# Altium schematic symbol library Diode - Rectifier.SchLib: 777 symbols (part 4 of 4)
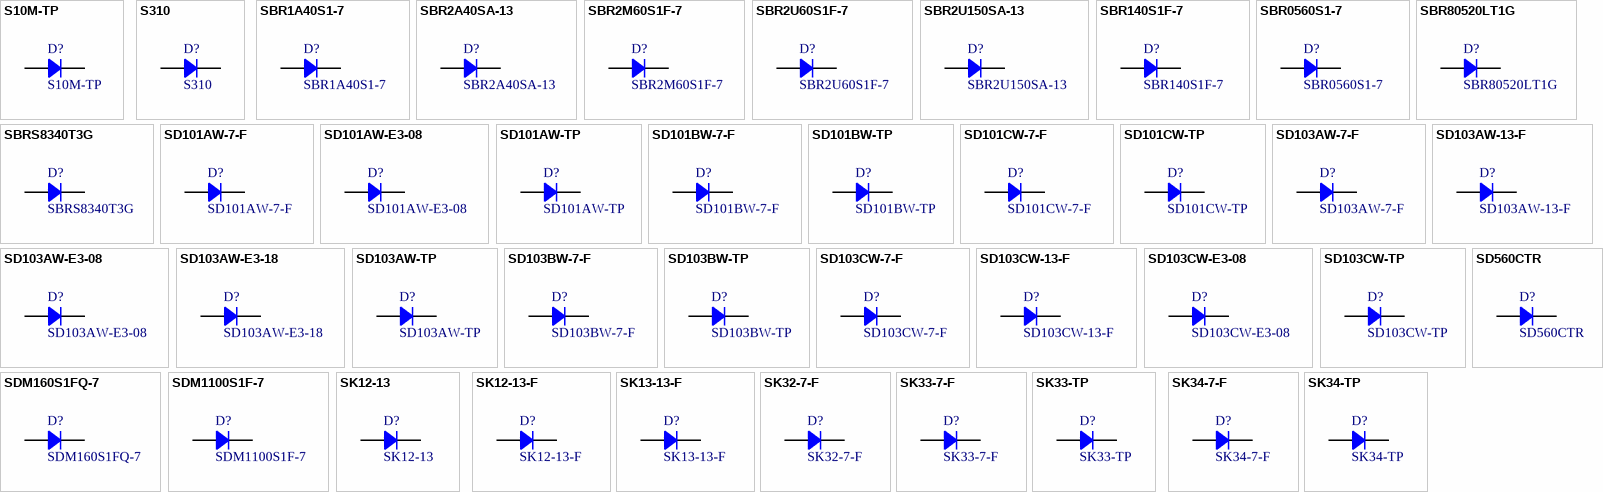
[diagram p22: symbols S10M-TP to SK34-TP]

## SDM1100S1F-7
designator D?
DIODE SCHOTTKY 100V 1A SOD123F; Manufacturer: Diodes Incorporated; Current Reverse Leakage @ Vr: 5uA @ 100V; Voltage Forward (Vf): 820mV @ 1A; Part Number: SDM1100S1F-7; PartId: 29289; Supplier 1: Digi-Key; Supplier Part Number 1: SDM1100S1F-7DICT-ND; ComponentLink1Description: Datasheet; ComponentLink1URL: http://www.diodes.com/_files/datasheets/SDM1100S1F.pdf; ComponentLink2Description: Digi-Key Listing; ComponentLink2URL: https://www.digikey.com/product-detail/en/diodes-incorporated/SDM1100S1F-7/SDM1100S1F-7DICT-ND/6010180; Junction Operating Temperature: -55C ~ 150C; Price: 0.47; Type: Schottky; Device Package: SOD-123F; Voltage DC Reverse (Vr): 100V; Current Rectified: 1A
footprint SOD123F
pins: 1, 2

## SK12-13
designator D?
DIODE SCHOTTKY 20V 1A SMB; Manufacturer: Diodes Incorporated; Current Reverse Leakage @ Vr: 500uA @ 20V; Voltage Forward (Vf): 550mV @ 1A; Part Number: SK12-13; PartId: 16314; Supplier 1: Digi-Key; Supplier Part Number 1: 981-SK12-13-CHP; ComponentLink1Description: Datasheet; ComponentLink1URL: //media.digikey.com/pdf/Data%20Sheets/Diodes%20PDFs/SK12-SK16.pdf; ComponentLink2Description: Digi-Key Listing; ComponentLink2URL: https://www.digikey.com/product-detail/en/diodes-incorporated/SK12-13/981-SK12-13-CHP/2344485; Junction Operating Temperature: -65C ~ 125C; Price: 0.1743; Type: Schottky; Device Package: DO-214AA, SMB; Voltage DC Reverse (Vr): 20V; Current Rectified: 1A
footprint DO214AA SMB
pins: 1, 2

## SK12-13-F
designator D?
DIODE SCHOTTKY 20V 1A SMB; Manufacturer: Diodes Incorporated; Current Reverse Leakage @ Vr: 500uA @ 20V; Voltage Forward (Vf): 550mV @ 1A; Part Number: SK12-13-F; PartId: 16263; Supplier 1: Digi-Key; Supplier Part Number 1: SK12-FDITR-ND; ComponentLink1Description: Datasheet; ComponentLink1URL: //media.digikey.com/pdf/Data%20Sheets/Diodes%20PDFs/SK12-SK16.pdf; ComponentLink2Description: Digi-Key Listing; ComponentLink2URL: https://www.digikey.com/product-detail/en/diodes-incorporated/SK12-13-F/SK12-FDITR-ND/814698; Junction Operating Temperature: -65C ~ 125C; Price: 0.2175; Type: Schottky; Device Package: DO-214AA, SMB; Voltage DC Reverse (Vr): 20V; Current Rectified: 1A
footprint DO214AA SMB
pins: 1, 2

## SK13-13-F
designator D?
DIODE SCHOTTKY 30V 1A SMB; Manufacturer: Diodes Incorporated; Current Reverse Leakage @ Vr: 500uA @ 30V; Voltage Forward (Vf): 550mV @ 1A; Part Number: SK13-13-F; PartId: 16264; Supplier 1: Digi-Key; Supplier Part Number 1: SK13-FDITR-ND; ComponentLink1Description: Datasheet; ComponentLink1URL: //media.digikey.com/pdf/Data%20Sheets/Diodes%20PDFs/SK12-SK16.pdf; ComponentLink2Description: Digi-Key Listing; ComponentLink2URL: https://www.digikey.com/product-detail/en/diodes-incorporated/SK13-13-F/SK13-FDITR-ND/725031; Junction Operating Temperature: -65C ~ 125C; Price: 0.2247; Type: Schottky; Device Package: DO-214AA, SMB; Voltage DC Reverse (Vr): 30V; Current Rectified: 1A
footprint DO214AA SMB
pins: 1, 2

## SK32-7-F
designator D?
DIODE SCHOTTKY 20V 3A SMC; Manufacturer: Diodes Incorporated; Current Reverse Leakage @ Vr: 500uA @ 20V; Voltage Forward (Vf): 500mV @ 3A; Part Number: SK32-7-F; PartId: 16230; Supplier 1: Digi-Key; Supplier Part Number 1: SK32-FDITR-ND; ComponentLink1Description: Datasheet; ComponentLink1URL: //media.digikey.com/pdf/Data%20Sheets/Diodes%20PDFs/SK32-SK36.pdf; ComponentLink2Description: Digi-Key Listing; ComponentLink2URL: https://www.digikey.com/product-detail/en/diodes-incorporated/SK32-7-F/SK32-FDITR-ND/814701; Junction Operating Temperature: -65C ~ 150C; Price: 0.684; Type: Schottky; Device Package: DO-214AB, SMC; Voltage DC Reverse (Vr): 20V; Current Rectified: 3A
footprint DO214AB SMC
pins: 1, 2

## SK33-7-F
designator D?
DIODE SCHOTTKY 30V 3A SMC; Manufacturer: Diodes Incorporated; Current Reverse Leakage @ Vr: 500uA @ 30V; Voltage Forward (Vf): 500mV @ 3A; Part Number: SK33-7-F; PartId: 27890; Supplier 1: Digi-Key; Supplier Part Number 1: SK33-FDICT-ND; ComponentLink1Description: Datasheet; ComponentLink1URL: //media.digikey.com/pdf/Data%20Sheets/Diodes%20PDFs/SK32-SK36.pdf; ComponentLink2Description: Digi-Key Listing; ComponentLink2URL: https://www.digikey.com/product-detail/en/diodes-incorporated/SK33-7-F/SK33-FDICT-ND/815991; Junction Operating Temperature: -65C ~ 150C; Price: 0.54; Type: Schottky; Device Package: DO-214AB, SMC; Voltage DC Reverse (Vr): 30V; Current Rectified: 3A
footprint ST DO214AB SMC
pins: 1, 2

## SK33-TP
designator D?
DIODE SCHOTTKY 30V 3A DO214AB; Manufacturer: Micro Commercial Co; Current Reverse Leakage @ Vr: 500uA @ 30V; Voltage Forward (Vf): 500mV @ 3A; Part Number: SK33-TP; PartId: 27768; Supplier 1: Digi-Key; Supplier Part Number 1: SK33-TPMSCT-ND; ComponentLink1Description: Datasheet; ComponentLink1URL: http://www.mccsemi.com/up_pdf/SK32-SK310(DO-214AB).PDF; ComponentLink2Description: Digi-Key Listing; ComponentLink2URL: https://www.digikey.com/product-detail/en/micro-commercial-co/SK33-TP/SK33-TPMSCT-ND/773726; Junction Operating Temperature: -55C ~ 150C; Price: 0.48; Type: Schottky; Device Package: DO-214AB, SMC; Voltage DC Reverse (Vr): 30V; Current Rectified: 3A
footprint ST DO214AB SMC
pins: 1, 2

## SK34-7-F
designator D?
DIODE SCHOTTKY 40V 3A SMC; Manufacturer: Diodes Incorporated; Current Reverse Leakage @ Vr: 500uA @ 40V; Voltage Forward (Vf): 500mV @ 3A; Part Number: SK34-7-F; PartId: 16231; Supplier 1: Digi-Key; Supplier Part Number 1: SK34-FDITR-ND; ComponentLink1Description: Datasheet; ComponentLink1URL: //media.digikey.com/pdf/Data%20Sheets/Diodes%20PDFs/SK32-SK36.pdf; ComponentLink2Description: Digi-Key Listing; ComponentLink2URL: https://www.digikey.com/product-detail/en/diodes-incorporated/SK34-7-F/SK34-FDITR-ND/806553; Junction Operating Temperature: -65C ~ 150C; Price: 0.722; Type: Schottky; Device Package: DO-214AB, SMC; Voltage DC Reverse (Vr): 40V; Current Rectified: 3A
footprint DO214AB SMC
pins: 1, 2

## SK34-TP
designator D?
DIODE SCHOTTKY 40V 3A DO214AB; Manufacturer: Micro Commercial Co; Current Reverse Leakage @ Vr: 500uA @ 40V; Voltage Forward (Vf): 500mV @ 3A; Part Number: SK34-TP; PartId: 27725; Supplier 1: Digi-Key; Supplier Part Number 1: SK34-TPMSCT-ND; ComponentLink1Description: Datasheet; ComponentLink1URL: http://www.mccsemi.com/up_pdf/SK32-SK310(DO-214AB).PDF; ComponentLink2Description: Digi-Key Listing; ComponentLink2URL: https://www.digikey.com/product-detail/en/micro-commercial-co/SK34-TP/SK34-TPMSCT-ND/773727; Junction Operating Temperature: -55C ~ 150C; Price: 0.48; Type: Schottky; Device Package: DO-214AB, SMC; Voltage DC Reverse (Vr): 40V; Current Rectified: 3A
footprint ST DO214AB SMC
pins: 1, 2

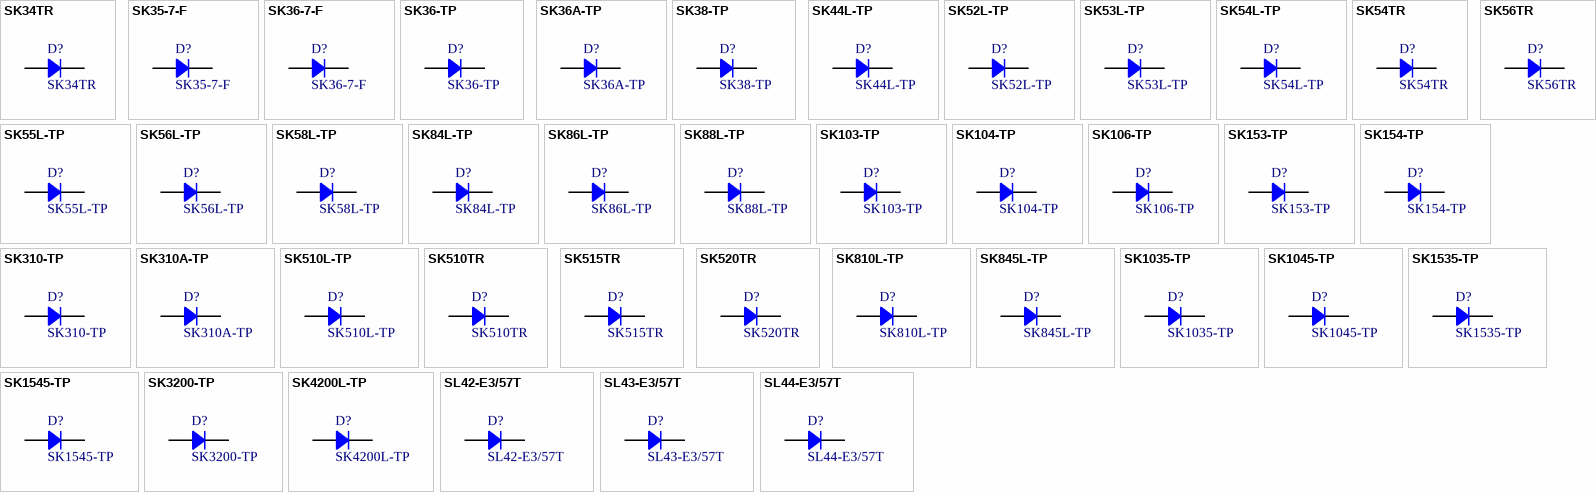
[diagram p16: symbols SK34TR to SL44-E3/57T]

## SK34TR
designator D?
DIODE SCHOTTKY 40V 3A SMB; Manufacturer: SMC Diode Solutions; Current Reverse Leakage @ Vr: 50uA @ 40V; Voltage Forward (Vf): 630mV @ 3A; Part Number: SK34TR; PartId: 27795; Supplier 1: Digi-Key; Supplier Part Number 1: 1655-1593-1-ND; ComponentLink1Description: Datasheet; ComponentLink1URL: http://www.smc-diodes.com/propdf/SK34%20N0102%20REV.-.pdf; ComponentLink2Description: Digi-Key Listing; ComponentLink2URL: https://www.digikey.com/product-detail/en/smc-diode-solutions/SK34TR/1655-1593-1-ND/6023038; Junction Operating Temperature: -55C ~ 150C; Price: 0.51; Type: Schottky; Device Package: DO-214AB, SMC; Voltage DC Reverse (Vr): 40V; Current Rectified: 3A
footprint ST DO214AB SMC
pins: 1, 2

## SK35-7-F
designator D?
DIODE SCHOTTKY 50V 3A SMC; Manufacturer: Diodes Incorporated; Current Reverse Leakage @ Vr: 500uA @ 50V; Voltage Forward (Vf): 750mV @ 3A; Part Number: SK35-7-F; PartId: 16233; Supplier 1: Digi-Key; Supplier Part Number 1: SK35-FDITR-ND; ComponentLink1Description: Datasheet; ComponentLink1URL: //media.digikey.com/pdf/Data%20Sheets/Diodes%20PDFs/SK32-SK36.pdf; ComponentLink2Description: Digi-Key Listing; ComponentLink2URL: https://www.digikey.com/product-detail/en/diodes-incorporated/SK35-7-F/SK35-FDITR-ND/814699; Junction Operating Temperature: -65C ~ 150C; Price: 0.264; Type: Schottky; Device Package: DO-214AB, SMC; Voltage DC Reverse (Vr): 50V; Current Rectified: 3A
footprint DO214AB SMC
pins: 1, 2

## SK36-7-F
designator D?
DIODE SCHOTTKY 60V 3A SMC; Manufacturer: Diodes Incorporated; Current Reverse Leakage @ Vr: 500uA @ 60V; Voltage Forward (Vf): 750mV @ 3A; Part Number: SK36-7-F; PartId: 16237; Supplier 1: Digi-Key; Supplier Part Number 1: SK36-FDITR-ND; ComponentLink1Description: Datasheet; ComponentLink1URL: //media.digikey.com/pdf/Data%20Sheets/Diodes%20PDFs/SK32-SK36.pdf; ComponentLink2Description: Digi-Key Listing; ComponentLink2URL: https://www.digikey.com/product-detail/en/diodes-incorporated/SK36-7-F/SK36-FDITR-ND/814709; Junction Operating Temperature: -65C ~ 150C; Price: 0.3; Type: Schottky; Device Package: DO-214AB, SMC; Voltage DC Reverse (Vr): 60V; Current Rectified: 3A
footprint DO214AB SMC
pins: 1, 2

## SK36-TP
designator D?
DIODE SCHOTTKY 60V 3A DO214AB; Manufacturer: Micro Commercial Co; Current Reverse Leakage @ Vr: 500uA @ 60V; Voltage Forward (Vf): 750mV @ 3A; Part Number: SK36-TP; PartId: 27724; Supplier 1: Digi-Key; Supplier Part Number 1: SK36-TPMSCT-ND; ComponentLink1Description: Datasheet; ComponentLink1URL: http://www.mccsemi.com/up_pdf/SK32-SK310(DO-214AB).PDF; ComponentLink2Description: Digi-Key Listing; ComponentLink2URL: https://www.digikey.com/product-detail/en/micro-commercial-co/SK36-TP/SK36-TPMSCT-ND/773729; Junction Operating Temperature: -55C ~ 150C; Price: 0.48; Type: Schottky; Device Package: DO-214AB, SMC; Voltage DC Reverse (Vr): 60V; Current Rectified: 3A
footprint ST DO214AB SMC
pins: 1, 2

## SK36A-TP
designator D?
DIODE SCHOTTKY 60V 3A DO214AC; Manufacturer: Micro Commercial Co; Current Reverse Leakage @ Vr: 500uA @ 60V; Voltage Forward (Vf): 750mV @ 3A; Part Number: SK36A-TP; PartId: 18055; Supplier 1: Digi-Key; Supplier Part Number 1: SK36A-TPTR-ND; ComponentLink1Description: Datasheet; ComponentLink1URL: http://www.mccsemi.com/up_pdf/SK32A-SK310A(HSMA).PDF; ComponentLink2Description: Digi-Key Listing; ComponentLink2URL: https://www.digikey.com/product-detail/en/micro-commercial-co/SK36A-TP/SK36A-TPTR-ND/950458; Junction Operating Temperature: -50C ~ 125C; Price: 0.157; Type: Schottky; Device Package: DO-214AC, SMA; Voltage DC Reverse (Vr): 60V; Current Rectified: 3A
footprint ST DO214AC SMA
pins: 1, 2

## SK38-TP
designator D?
DIODE SCHOTTKY 80V 3A DO214AB; Manufacturer: Micro Commercial Co; Current Reverse Leakage @ Vr: 500uA @ 80V; Voltage Forward (Vf): 850mV @ 3A; Part Number: SK38-TP; PartId: 27767; Supplier 1: Digi-Key; Supplier Part Number 1: SK38-TPMSCT-ND; ComponentLink1Description: Datasheet; ComponentLink1URL: http://www.mccsemi.com/up_pdf/SK32-SK310(DO-214AB).PDF; ComponentLink2Description: Digi-Key Listing; ComponentLink2URL: https://www.digikey.com/product-detail/en/micro-commercial-co/SK38-TP/SK38-TPMSCT-ND/773730; Junction Operating Temperature: -55C ~ 150C; Price: 0.48; Type: Schottky; Device Package: DO-214AB, SMC; Voltage DC Reverse (Vr): 80V; Current Rectified: 3A
footprint ST DO214AB SMC
pins: 1, 2

## SK44L-TP
designator D?
DIODE SCHOTTKY 4A 40V SMC; Manufacturer: Micro Commercial Co; Current Reverse Leakage @ Vr: 500uA @ 40V; Voltage Forward (Vf): 450mV @ 4A; Part Number: SK44L-TP; PartId: 27829; Supplier 1: Digi-Key; Supplier Part Number 1: SK44L-TPMSCT-ND; ComponentLink1Description: Datasheet; ComponentLink1URL: http://www.mccsemi.com/up_pdf/SK42L-SK44L(DO-214AB).pdf; ComponentLink2Description: Digi-Key Listing; ComponentLink2URL: https://www.digikey.com/product-detail/en/micro-commercial-co/SK44L-TP/SK44L-TPMSCT-ND/5418803; Junction Operating Temperature: -55C ~ 125C; Price: 0.49; Type: Schottky; Device Package: DO-214AB, SMC; Voltage DC Reverse (Vr): 40V; Current Rectified: 4A
footprint ST DO214AB SMC
pins: 1, 2

## SK52L-TP
designator D?
DIODE SCHOTTKY 20V 5A DO214AB; Manufacturer: Micro Commercial Co; Current Reverse Leakage @ Vr: 1mA @ 20V; Voltage Forward (Vf): 550mV @ 5A; Part Number: SK52L-TP; PartId: 27825; Supplier 1: Digi-Key; Supplier Part Number 1: SK52L-TPMSCT-ND; ComponentLink1Description: Datasheet; ComponentLink1URL: http://www.mccsemi.com/up_pdf/SK52L-SK510L(DO-214AB).PDF; ComponentLink2Description: Digi-Key Listing; ComponentLink2URL: https://www.digikey.com/product-detail/en/micro-commercial-co/SK52L-TP/SK52L-TPMSCT-ND/4966296; Junction Operating Temperature: -55C ~ 150C; Price: 0.49; Type: Schottky; Device Package: DO-214AB, SMC; Voltage DC Reverse (Vr): 20V; Current Rectified: 5A
footprint ST DO214AB SMC
pins: 1, 2

## SK53L-TP
designator D?
DIODE SCHOTTKY 30V 5A DO214AB; Manufacturer: Micro Commercial Co; Current Reverse Leakage @ Vr: 1mA @ 30V; Voltage Forward (Vf): 550mV @ 5A; Part Number: SK53L-TP; PartId: 27831; Supplier 1: Digi-Key; Supplier Part Number 1: SK53L-TPMSCT-ND; ComponentLink1Description: Datasheet; ComponentLink1URL: http://www.mccsemi.com/up_pdf/SK52L-SK510L(DO-214AB).PDF; ComponentLink2Description: Digi-Key Listing; ComponentLink2URL: https://www.digikey.com/product-detail/en/micro-commercial-co/SK53L-TP/SK53L-TPMSCT-ND/4966297; Junction Operating Temperature: -55C ~ 150C; Price: 0.49; Type: Schottky; Device Package: DO-214AB, SMC; Voltage DC Reverse (Vr): 30V; Current Rectified: 5A
footprint ST DO214AB SMC
pins: 1, 2

## SK54L-TP
designator D?
DIODE SCHOTTKY 40V 5A DO214AB; Manufacturer: Micro Commercial Co; Current Reverse Leakage @ Vr: 1mA @ 40V; Voltage Forward (Vf): 550mV @ 5A; Part Number: SK54L-TP; PartId: 27827; Supplier 1: Digi-Key; Supplier Part Number 1: SK54L-TPMSCT-ND; ComponentLink1Description: Datasheet; ComponentLink1URL: http://www.mccsemi.com/up_pdf/SK52L-SK510L(DO-214AB).PDF; ComponentLink2Description: Digi-Key Listing; ComponentLink2URL: https://www.digikey.com/product-detail/en/micro-commercial-co/SK54L-TP/SK54L-TPMSCT-ND/4071513; Junction Operating Temperature: -55C ~ 150C; Price: 0.49; Type: Schottky; Device Package: DO-214AB, SMC; Voltage DC Reverse (Vr): 40V; Current Rectified: 5A
footprint ST DO214AB SMC
pins: 1, 2

## SK54TR
designator D?
DIODE SCHOTTKY 40V SMC; Manufacturer: SMC Diode Solutions; Current Reverse Leakage @ Vr: 1mA @ 40V; Voltage Forward (Vf): 650mV @ 5A; Part Number: SK54TR; PartId: 27812; Supplier 1: Digi-Key; Supplier Part Number 1: 1655-1605-1-ND; ComponentLink1Description: Datasheet; ComponentLink1URL: http://www.smc-diodes.com/propdf/SK54%20N0939%20REV.-.pdf; ComponentLink2Description: Digi-Key Listing; ComponentLink2URL: https://www.digikey.com/product-detail/en/smc-diode-solutions/SK54TR/1655-1605-1-ND/6023050; Junction Operating Temperature: -55C ~ 150C; Price: 0.4; Type: Schottky; Device Package: DO-214AB, SMC; Voltage DC Reverse (Vr): 40V
footprint ST DO214AB SMC
pins: 1, 2

## SK55L-TP
designator D?
DIODE SCHOTTKY 50V 5A DO214AB; Manufacturer: Micro Commercial Co; Current Reverse Leakage @ Vr: 1mA @ 50V; Voltage Forward (Vf): 750mV @ 5A; Part Number: SK55L-TP; PartId: 27826; Supplier 1: Digi-Key; Supplier Part Number 1: SK55L-TPMSCT-ND; ComponentLink1Description: Datasheet; ComponentLink1URL: http://www.mccsemi.com/up_pdf/SK52L-SK510L(DO-214AB).PDF; ComponentLink2Description: Digi-Key Listing; ComponentLink2URL: https://www.digikey.com/product-detail/en/micro-commercial-co/SK55L-TP/SK55L-TPMSCT-ND/4071514; Junction Operating Temperature: -55C ~ 150C; Price: 0.49; Type: Schottky; Device Package: DO-214AB, SMC; Voltage DC Reverse (Vr): 50V; Current Rectified: 5A
footprint ST DO214AB SMC
pins: 1, 2

## SK56L-TP
designator D?
DIODE SCHOTTKY 60V 5A DO214AB; Manufacturer: Micro Commercial Co; Current Reverse Leakage @ Vr: 1mA @ 60V; Voltage Forward (Vf): 750mV @ 5A; Part Number: SK56L-TP; PartId: 27727; Supplier 1: Digi-Key; Supplier Part Number 1: SK56L-TPMSCT-ND; ComponentLink1Description: Datasheet; ComponentLink1URL: http://www.mccsemi.com/up_pdf/SK52L-SK510L(DO-214AB).PDF; ComponentLink2Description: Digi-Key Listing; ComponentLink2URL: https://www.digikey.com/product-detail/en/micro-commercial-co/SK56L-TP/SK56L-TPMSCT-ND/4071515; Junction Operating Temperature: -55C ~ 150C; Price: 0.49; Type: Schottky; Device Package: DO-214AB, SMC; Voltage DC Reverse (Vr): 60V; Current Rectified: 5A
footprint ST DO214AB SMC
pins: 1, 2

## SK56TR
designator D?
DIODE SCHOTTKY 60V SMB; Manufacturer: SMC Diode Solutions; Current Reverse Leakage @ Vr: 1mA @ 60V; Voltage Forward (Vf): 700mV @ 5A; Part Number: SK56TR; PartId: 27810; Supplier 1: Digi-Key; Supplier Part Number 1: 1655-1607-1-ND; ComponentLink1Description: Datasheet; ComponentLink1URL: http://www.smc-diodes.com/propdf/SK56%20N0940%20REV.-.pdf; ComponentLink2Description: Digi-Key Listing; ComponentLink2URL: https://www.digikey.com/product-detail/en/smc-diode-solutions/SK56TR/1655-1607-1-ND/6023052; Junction Operating Temperature: -55C ~ 150C; Price: 0.4; Type: Schottky; Device Package: DO-214AB, SMC; Voltage DC Reverse (Vr): 60V
footprint ST DO214AB SMC
pins: 1, 2

## SK58L-TP
designator D?
DIODE SCHOTTKY 80V 5A DO214AB; Manufacturer: Micro Commercial Co; Current Reverse Leakage @ Vr: 1mA @ 80V; Voltage Forward (Vf): 850mV @ 5A; Part Number: SK58L-TP; PartId: 27900; Supplier 1: Digi-Key; Supplier Part Number 1: SK58L-TPMSCT-ND; ComponentLink1Description: Datasheet; ComponentLink1URL: http://www.mccsemi.com/up_pdf/SK52L-SK510L(DO-214AB).PDF; ComponentLink2Description: Digi-Key Listing; ComponentLink2URL: https://www.digikey.com/product-detail/en/micro-commercial-co/SK58L-TP/SK58L-TPMSCT-ND/4966298; Junction Operating Temperature: -55C ~ 150C; Price: 0.49; Type: Schottky; Device Package: DO-214AB, SMC; Voltage DC Reverse (Vr): 80V; Current Rectified: 5A
footprint ST DO214AB SMC
pins: 1, 2

## SK84L-TP
designator D?
DIODE SCHOTTKY 40V 8A DO214AB; Manufacturer: Micro Commercial Co; Current Reverse Leakage @ Vr: 1mA @ 40V; Voltage Forward (Vf): 650mV @ 8A; Part Number: SK84L-TP; PartId: 27752; Supplier 1: Digi-Key; Supplier Part Number 1: SK84L-TPMSCT-ND; ComponentLink1Description: Datasheet; ComponentLink1URL: http://www.mccsemi.com/up_pdf/SK82L-SK810L(SMC).PDF; ComponentLink2Description: Digi-Key Listing; ComponentLink2URL: https://www.digikey.com/product-detail/en/micro-commercial-co/SK84L-TP/SK84L-TPMSCT-ND/3191624; Junction Operating Temperature: -55C ~ 150C; Price: 0.74; Type: Schottky; Device Package: DO-214AB, SMC; Voltage DC Reverse (Vr): 40V; Current Rectified: 8A
footprint ST DO214AB SMC
pins: 1, 2

## SK86L-TP
designator D?
DIODE SCHOTTKY 60V 8A DO214AB; Manufacturer: Micro Commercial Co; Current Reverse Leakage @ Vr: 1mA @ 60V; Voltage Forward (Vf): 650mV @ 8A; Part Number: SK86L-TP; PartId: 27701; Supplier 1: Digi-Key; Supplier Part Number 1: SK86L-TPMSCT-ND; ComponentLink1Description: Datasheet; ComponentLink1URL: http://www.mccsemi.com/up_pdf/SK82L-SK810L(SMC).PDF; ComponentLink2Description: Digi-Key Listing; ComponentLink2URL: https://www.digikey.com/product-detail/en/micro-commercial-co/SK86L-TP/SK86L-TPMSCT-ND/4966300; Junction Operating Temperature: -55C ~ 150C; Price: 0.74; Type: Schottky; Device Package: DO-214AB, SMC; Voltage DC Reverse (Vr): 60V; Current Rectified: 8A
footprint ST DO214AB SMC
pins: 1, 2

## SK88L-TP
designator D?
DIODE SCHOTTKY 80V 8A DO214AB; Manufacturer: Micro Commercial Co; Current Reverse Leakage @ Vr: 1mA @ 80V; Voltage Forward (Vf): 800mV @ 8A; Part Number: SK88L-TP; PartId: 27906; Supplier 1: Digi-Key; Supplier Part Number 1: SK88L-TPMSCT-ND; ComponentLink1Description: Datasheet; ComponentLink1URL: http://www.mccsemi.com/up_pdf/SK82L-SK810L(SMC).PDF; ComponentLink2Description: Digi-Key Listing; ComponentLink2URL: https://www.digikey.com/product-detail/en/micro-commercial-co/SK88L-TP/SK88L-TPMSCT-ND/4966301; Junction Operating Temperature: -55C ~ 150C; Price: 0.74; Type: Schottky; Device Package: DO-214AB, SMC; Voltage DC Reverse (Vr): 80V; Current Rectified: 8A
footprint ST DO214AB SMC
pins: 1, 2

## SK103-TP
designator D?
DIODE SCHOTTKY 30V 10A DO214AB; Manufacturer: Micro Commercial Co; Current Reverse Leakage @ Vr: 1mA @ 30V; Voltage Forward (Vf): 650mV @ 10A; Part Number: SK103-TP; PartId: 27757; Supplier 1: Digi-Key; Supplier Part Number 1: SK103-TPCT-ND; ComponentLink1Description: Datasheet; ComponentLink1URL: http://www.mccsemi.com/up_pdf/SK102-SK1010(HSMC).PDF; ComponentLink2Description: Digi-Key Listing; ComponentLink2URL: https://www.digikey.com/product-detail/en/micro-commercial-co/SK103-TP/SK103-TPCT-ND/1306211; Junction Operating Temperature: -55C ~ 125C; Price: 0.9; Type: Schottky; Device Package: DO-214AB, SMC; Voltage DC Reverse (Vr): 30V; Current Rectified: 10A
footprint ST DO214AB SMC
pins: 1, 2

## SK104-TP
designator D?
DIODE SCHOTTKY 40V 10A DO214AB; Manufacturer: Micro Commercial Co; Current Reverse Leakage @ Vr: 1mA @ 40V; Voltage Forward (Vf): 650mV @ 10A; Part Number: SK104-TP; PartId: 27706; Supplier 1: Digi-Key; Supplier Part Number 1: SK104-TPCT-ND; ComponentLink1Description: Datasheet; ComponentLink1URL: http://www.mccsemi.com/up_pdf/SK102-SK1010(HSMC).PDF; ComponentLink2Description: Digi-Key Listing; ComponentLink2URL: https://www.digikey.com/product-detail/en/micro-commercial-co/SK104-TP/SK104-TPCT-ND/1306212; Junction Operating Temperature: -55C ~ 125C; Price: 0.9; Type: Schottky; Device Package: DO-214AB, SMC; Voltage DC Reverse (Vr): 40V; Current Rectified: 10A
footprint ST DO214AB SMC
pins: 1, 2

## SK106-TP
designator D?
DIODE SCHOTTKY 60V 10A DO214AB; Manufacturer: Micro Commercial Co; Type: Surface Mount; Current Reverse Leakage @ Vr: 1mA @ 60V; Voltage Forward (Vf): 850mV @ 10A; Part Number: SK106-TP; PartId: 7135; Supplier 1: Digi-Key; Supplier Part Number 1: SK106-TPTR-ND; ComponentLink1Description: Datasheet; ComponentLink1URL: http://www.mccsemi.com/up_pdf/SK102-SK1010(HSMC).PDF; ComponentLink2Description: Digi-Key Listing; ComponentLink2URL: http://www.digikey.ca/product-detail/en/SK106-TP/SK106-TPTR-ND/1306162; Junction Operating Temperature: -55C ~ 125C; Price: 0.5378; Device Package: DO-214AB, SMC; Reverse Recovery Time (trr): -; Voltage DC Reverse (Vr): 60V; Current Rectified: 10A
footprint DO214AB SMC
pins: 1, 2

## SK153-TP
designator D?
DIODE SCHOTTKY 30V 15A DO214AB; Manufacturer: Micro Commercial Co; Type: Surface Mount; Current Reverse Leakage @ Vr: 1mA @ 30V; Voltage Forward (Vf): 550mV @ 15A; Part Number: SK153-TP; PartId: 7133; Supplier 1: Digi-Key; Supplier Part Number 1: SK153-TPTR-ND; ComponentLink1Description: Datasheet; ComponentLink1URL: http://www.mccsemi.com/up_pdf/SK152-SK1510(HSMC).PDF; ComponentLink2Description: Digi-Key Listing; ComponentLink2URL: http://www.digikey.ca/product-detail/en/SK153-TP/SK153-TPTR-ND/1306165; Junction Operating Temperature: -55C ~ 125C; Price: 0.753; Device Package: DO-214AB, SMC; Reverse Recovery Time (trr): -; Voltage DC Reverse (Vr): 30V; Current Rectified: 15A
footprint DO214AB SMC
pins: 1, 2

## SK154-TP
designator D?
DIODE SCHOTTKY 40V 15A DO214AB; Manufacturer: Micro Commercial Co; Type: Surface Mount; Current Reverse Leakage @ Vr: 1mA @ 40V; Voltage Forward (Vf): 550mV @ 15A; Part Number: SK154-TP; PartId: 7134; Supplier 1: Digi-Key; Supplier Part Number 1: SK154-TPTR-ND; ComponentLink1Description: Datasheet; ComponentLink1URL: http://www.mccsemi.com/up_pdf/SK152-SK1510(HSMC).PDF; ComponentLink2Description: Digi-Key Listing; ComponentLink2URL: http://www.digikey.ca/product-detail/en/SK154-TP/SK154-TPTR-ND/1306166; Junction Operating Temperature: -55C ~ 125C; Price: 0.753; Device Package: DO-214AB, SMC; Reverse Recovery Time (trr): -; Voltage DC Reverse (Vr): 40V; Current Rectified: 15A
footprint DO214AB SMC
pins: 1, 2

## SK310-TP
designator D?
DIODE SCHOTTKY 3A 100V SMC; Manufacturer: Micro Commercial Co; Current Reverse Leakage @ Vr: 500uA @ 100V; Voltage Forward (Vf): 850mV @ 3A; Part Number: SK310-TP; PartId: 27819; Supplier 1: Digi-Key; Supplier Part Number 1: SK310-TPMSCT-ND; ComponentLink1Description: Datasheet; ComponentLink1URL: http://www.mccsemi.com/up_pdf/SK32-SK310(DO-214AB).PDF; ComponentLink2Description: Digi-Key Listing; ComponentLink2URL: https://www.digikey.com/product-detail/en/micro-commercial-co/SK310-TP/SK310-TPMSCT-ND/5418802; Junction Operating Temperature: -55C ~ 150C; Price: 0.48; Type: Schottky; Device Package: DO-214AB, SMC; Voltage DC Reverse (Vr): 100V; Current Rectified: 3A
footprint ST DO214AB SMC
pins: 1, 2

## SK310A-TP
designator D?
DIODE SCHOTTKY 100V 3A DO214AC; Manufacturer: Micro Commercial Co; Current Reverse Leakage @ Vr: 500uA @ 100V; Voltage Forward (Vf): 850mV @ 3A; Part Number: SK310A-TP; PartId: 18051; Supplier 1: Digi-Key; Supplier Part Number 1: SK310A-TPTR-ND; ComponentLink1Description: Datasheet; ComponentLink1URL: http://www.mccsemi.com/up_pdf/SK32A-SK310A(HSMA).PDF; ComponentLink2Description: Digi-Key Listing; ComponentLink2URL: https://www.digikey.com/product-detail/en/micro-commercial-co/SK310A-TP/SK310A-TPTR-ND/950448; Junction Operating Temperature: -50C ~ 125C; Price: 0.157; Type: Schottky; Device Package: DO-214AC, SMA; Voltage DC Reverse (Vr): 100V; Current Rectified: 3A
footprint ST DO214AC SMA
pins: 1, 2

## SK510L-TP
designator D?
DIODE SCHOTTKY 100V 5A DO214AB; Manufacturer: Micro Commercial Co; Current Reverse Leakage @ Vr: 1mA @ 100V; Voltage Forward (Vf): 850mV @ 5A; Part Number: SK510L-TP; PartId: 27822; Supplier 1: Digi-Key; Supplier Part Number 1: SK510L-TPMSCT-ND; ComponentLink1Description: Datasheet; ComponentLink1URL: http://www.mccsemi.com/up_pdf/SK52L-SK510L(DO-214AB).PDF; ComponentLink2Description: Digi-Key Listing; ComponentLink2URL: https://www.digikey.com/product-detail/en/micro-commercial-co/SK510L-TP/SK510L-TPMSCT-ND/4071512; Junction Operating Temperature: -55C ~ 150C; Price: 0.49; Type: Schottky; Device Package: DO-214AB, SMC; Voltage DC Reverse (Vr): 100V; Current Rectified: 5A
footprint ST DO214AB SMC
pins: 1, 2

## SK510TR
designator D?
DIODE SCHOTTKY 100V SMB; Manufacturer: SMC Diode Solutions; Current Reverse Leakage @ Vr: 100uA @ 100V; Voltage Forward (Vf): 850mV @ 5A; Part Number: SK510TR; PartId: 27808; Supplier 1: Digi-Key; Supplier Part Number 1: 1655-1599-1-ND; ComponentLink1Description: Datasheet; ComponentLink1URL: http://www.smc-diodes.com/propdf/SK510%20N1113%20REV.-.pdf; ComponentLink2Description: Digi-Key Listing; ComponentLink2URL: https://www.digikey.com/product-detail/en/smc-diode-solutions/SK510TR/1655-1599-1-ND/6023044; Junction Operating Temperature: -55C ~ 150C; Price: 0.4; Type: Schottky; Device Package: DO-214AB, SMC; Voltage DC Reverse (Vr): 100V
footprint ST DO214AB SMC
pins: 1, 2

## SK515TR
designator D?
DIODE SCHOTTKY 150V SMB; Manufacturer: SMC Diode Solutions; Current Reverse Leakage @ Vr: 1mA @ 150V; Voltage Forward (Vf): 930mV @ 5A; Part Number: SK515TR; PartId: 27811; Supplier 1: Digi-Key; Supplier Part Number 1: 1655-1601-1-ND; ComponentLink1Description: Datasheet; ComponentLink1URL: http://www.smc-diodes.com/propdf/SK515%20N0636%20REV.-.pdf; ComponentLink2Description: Digi-Key Listing; ComponentLink2URL: https://www.digikey.com/product-detail/en/smc-diode-solutions/SK515TR/1655-1601-1-ND/6023046; Junction Operating Temperature: -55C ~ 150C; Price: 0.4; Type: Schottky; Device Package: DO-214AB, SMC; Voltage DC Reverse (Vr): 150V
footprint ST DO214AB SMC
pins: 1, 2

## SK520TR
designator D?
DIODE SCHOTTKY 200V 5A SMC; Manufacturer: SMC Diode Solutions; Current Reverse Leakage @ Vr: 1mA @ 200V; Voltage Forward (Vf): 1.1V @ 5A; Part Number: SK520TR; PartId: 27796; Supplier 1: Digi-Key; Supplier Part Number 1: 1655-1603-1-ND; ComponentLink1Description: Datasheet; ComponentLink1URL: http://www.smc-diodes.com/propdf/SK520%20N0107%20REV.-.pdf; ComponentLink2Description: Digi-Key Listing; ComponentLink2URL: https://www.digikey.com/product-detail/en/smc-diode-solutions/SK520TR/1655-1603-1-ND/6023048; Junction Operating Temperature: -55C ~ 150C; Price: 0.4; Type: Schottky; Device Package: DO-214AB, SMC; Voltage DC Reverse (Vr): 200V; Current Rectified: 5A
footprint ST DO214AB SMC
pins: 1, 2

## SK810L-TP
designator D?
DIODE SCHOTTKY 100V 8A DO214AB; Manufacturer: Micro Commercial Co; Current Reverse Leakage @ Vr: 1mA @ 100V; Voltage Forward (Vf): 800mV @ 8A; Part Number: SK810L-TP; PartId: 27700; Supplier 1: Digi-Key; Supplier Part Number 1: SK810L-TPMSCT-ND; ComponentLink1Description: Datasheet; ComponentLink1URL: http://www.mccsemi.com/up_pdf/SK82L-SK810L(SMC).PDF; ComponentLink2Description: Digi-Key Listing; ComponentLink2URL: https://www.digikey.com/product-detail/en/micro-commercial-co/SK810L-TP/SK810L-TPMSCT-ND/2650908; Junction Operating Temperature: -55C ~ 150C; Price: 0.74; Type: Schottky; Device Package: DO-214AB, SMC; Voltage DC Reverse (Vr): 100V; Current Rectified: 8A
footprint ST DO214AB SMC
pins: 1, 2

## SK845L-TP
designator D?
DIODE SCHOTTKY 45V 8A DO214AB; Manufacturer: Micro Commercial Co; Current Reverse Leakage @ Vr: 1mA @ 45V; Voltage Forward (Vf): 650mV @ 8A; Part Number: SK845L-TP; PartId: 27905; Supplier 1: Digi-Key; Supplier Part Number 1: SK845L-TPMSCT-ND; ComponentLink1Description: Datasheet; ComponentLink1URL: http://www.mccsemi.com/up_pdf/SK82L-SK810L(SMC).PDF; ComponentLink2Description: Digi-Key Listing; ComponentLink2URL: https://www.digikey.com/product-detail/en/micro-commercial-co/SK845L-TP/SK845L-TPMSCT-ND/4966299; Junction Operating Temperature: -55C ~ 150C; Price: 0.74; Type: Schottky; Device Package: DO-214AB, SMC; Voltage DC Reverse (Vr): 45V; Current Rectified: 8A
footprint ST DO214AB SMC
pins: 1, 2

## SK1035-TP
designator D?
DIODE SCHOTTKY 35V 10A DO214AB; Manufacturer: Micro Commercial Co; Current Reverse Leakage @ Vr: 1mA @ 35V; Voltage Forward (Vf): 650mV @ 10A; Part Number: SK1035-TP; PartId: 27788; Supplier 1: Digi-Key; Supplier Part Number 1: SK1035-TPCT-ND; ComponentLink1Description: Datasheet; ComponentLink1URL: http://www.mccsemi.com/up_pdf/SK102-SK1010(HSMC).PDF; ComponentLink2Description: Digi-Key Listing; ComponentLink2URL: https://www.digikey.com/product-detail/en/micro-commercial-co/SK1035-TP/SK1035-TPCT-ND/1306215; Junction Operating Temperature: -55C ~ 125C; Price: 0.9; Type: Schottky; Device Package: DO-214AB, SMC; Voltage DC Reverse (Vr): 35V; Current Rectified: 10A
footprint ST DO214AB SMC
pins: 1, 2

## SK1045-TP
designator D?
DIODE SCHOTTKY 45V 10A DO214AB; Manufacturer: Micro Commercial Co; Type: Surface Mount; Current Reverse Leakage @ Vr: 1mA @ 45V; Voltage Forward (Vf): 650mV @ 10A; Part Number: SK1045-TP; PartId: 7136; Supplier 1: Digi-Key; Supplier Part Number 1: SK1045-TPTR-ND; ComponentLink1Description: Datasheet; ComponentLink1URL: http://www.mccsemi.com/up_pdf/SK102-SK1010(HSMC).PDF; ComponentLink2Description: Digi-Key Listing; ComponentLink2URL: http://www.digikey.ca/product-detail/en/SK1045-TP/SK1045-TPTR-ND/1306163; Junction Operating Temperature: -55C ~ 125C; Price: 0.5378; Device Package: DO-214AB, SMC; Reverse Recovery Time (trr): -; Voltage DC Reverse (Vr): 45V; Current Rectified: 10A
footprint DO214AB SMC
pins: 1, 2

## SK1535-TP
designator D?
DIODE SCHOTTKY 35V 15A DO214AB; Manufacturer: Micro Commercial Co; Type: Surface Mount; Current Reverse Leakage @ Vr: 1mA @ 35V; Voltage Forward (Vf): 550mV @ 15A; Part Number: SK1535-TP; PartId: 7132; Supplier 1: Digi-Key; Supplier Part Number 1: SK1535-TPTR-ND; ComponentLink1Description: Datasheet; ComponentLink1URL: http://www.mccsemi.com/up_pdf/SK152-SK1510(HSMC).PDF; ComponentLink2Description: Digi-Key Listing; ComponentLink2URL: http://www.digikey.ca/product-detail/en/SK1535-TP/SK1535-TPTR-ND/1306167; Junction Operating Temperature: -55C ~ 125C; Price: 0.753; Device Package: DO-214AB, SMC; Reverse Recovery Time (trr): -; Voltage DC Reverse (Vr): 35V; Current Rectified: 15A
footprint DO214AB SMC
pins: 1, 2

## SK1545-TP
designator D?
DIODE SCHOTTKY 45V 15A DO214AB; Manufacturer: Micro Commercial Co; Current Reverse Leakage @ Vr: 1mA @ 45V; Voltage Forward (Vf): 550mV @ 15A; Part Number: SK1545-TP; PartId: 27711; Supplier 1: Digi-Key; Supplier Part Number 1: SK1545-TPCT-ND; ComponentLink1Description: Datasheet; ComponentLink1URL: http://www.mccsemi.com/up_pdf/SK152-SK1510(HSMC).PDF; ComponentLink2Description: Digi-Key Listing; ComponentLink2URL: https://www.digikey.com/product-detail/en/micro-commercial-co/SK1545-TP/SK1545-TPCT-ND/1306219; Junction Operating Temperature: -55C ~ 125C; Price: 1.26; Type: Schottky; Device Package: DO-214AB, SMC; Voltage DC Reverse (Vr): 45V; Current Rectified: 15A
footprint ST DO214AB SMC
pins: 1, 2

## SK3200-TP
designator D?
DIODE SCHOTTKY 200V 3A DO214AB; Manufacturer: Micro Commercial Co; Current Reverse Leakage @ Vr: 500uA @ 200V; Voltage Forward (Vf): 860mV @ 3A; Part Number: SK3200-TP; PartId: 27862; Supplier 1: Digi-Key; Supplier Part Number 1: SK3200-TPMSCT-ND; ComponentLink1Description: Datasheet; ComponentLink1URL: http://www.mccsemi.com/up_pdf/SK3200(SMC).pdf; ComponentLink2Description: Digi-Key Listing; ComponentLink2URL: https://www.digikey.com/product-detail/en/micro-commercial-co/SK3200-TP/SK3200-TPMSCT-ND/2233947; Junction Operating Temperature: -55C ~ 150C; Price: 0.74; Type: Schottky; Device Package: DO-214AB, SMC; Voltage DC Reverse (Vr): 200V; Current Rectified: 3A
footprint ST DO214AB SMC
pins: 1, 2

## SK4200L-TP
designator D?
DIODE SCHOTTKY 200V 4A DO214AB; Manufacturer: Micro Commercial Co; Current Reverse Leakage @ Vr: 500uA @ 200V; Reverse Recovery Time (trr): 35ns; Voltage Forward (Vf): 860mV @ 4A; Part Number: SK4200L-TP; PartId: 27684; Supplier 1: Digi-Key; Supplier Part Number 1: SK4200L-TPMSCT-ND; ComponentLink1Description: Datasheet; ComponentLink1URL: http://www.mccsemi.com/up_pdf/SK4200L(SMC).pdf; ComponentLink2Description: Digi-Key Listing; ComponentLink2URL: https://www.digikey.com/product-detail/en/micro-commercial-co/SK4200L-TP/SK4200L-TPMSCT-ND/2233948; Junction Operating Temperature: -55C ~ 150C; Price: 0.49; Type: Schottky; Device Package: DO-214AB, SMC; Voltage DC Reverse (Vr): 200V; Current Rectified: 4A
footprint ST DO214AB SMC
pins: 1, 2

## SL42-E3/57T
designator D?
DIODE SCHOTTKY 20V 4A DO214AB; Manufacturer: Vishay Semiconductor Diodes Division; Type: Surface Mount; Current Reverse Leakage @ Vr: 500uA @ 20V; Voltage Forward (Vf): 420mV @ 4A; Part Number: SL42-E3/57T; PartId: 7157; Supplier 1: Digi-Key; Supplier Part Number 1: SL42-E3/57TGITR-ND; ComponentLink1Description: Datasheet; ComponentLink1URL: http://www.vishay.com/docs/88742/sl42.pdf; ComponentLink2Description: Digi-Key Listing; ComponentLink2URL: http://www.digikey.ca/product-detail/en/SL42-E3%2F57T/SL42-E3%2F57TGITR-ND/1091491; Junction Operating Temperature: -55C ~ 125C; Price: 0.6052; Device Package: DO-214AB, SMC; Reverse Recovery Time (trr): -; Voltage DC Reverse (Vr): 20V; Current Rectified: 4A
footprint DO214AB SMC
pins: 1, 2

## SL43-E3/57T
designator D?
DIODE SCHOTTKY 30V 4A DO214AB; Manufacturer: Vishay Semiconductor Diodes Division; Type: Surface Mount; Current Reverse Leakage @ Vr: 500uA @ 30V; Voltage Forward (Vf): 420mV @ 4A; Part Number: SL43-E3/57T; PartId: 7158; Supplier 1: Digi-Key; Supplier Part Number 1: SL43-E3/57TGITR-ND; ComponentLink1Description: Datasheet; ComponentLink1URL: http://www.vishay.com/docs/88742/sl42.pdf; ComponentLink2Description: Digi-Key Listing; ComponentLink2URL: http://www.digikey.ca/product-detail/en/SL43-E3%2F57T/SL43-E3%2F57TGITR-ND/1091492; Junction Operating Temperature: -55C ~ 125C; Price: 0.7641; Device Package: DO-214AB, SMC; Reverse Recovery Time (trr): -; Voltage DC Reverse (Vr): 30V; Current Rectified: 4A
footprint DO214AB SMC
pins: 1, 2

## SL44-E3/57T
designator D?
DIODE SCHOTTKY 40V 4A DO214AB; Manufacturer: Vishay Semiconductor Diodes Division; Current Reverse Leakage @ Vr: 500uA @ 40V; Voltage Forward (Vf): 440mV @ 4A; Part Number: SL44-E3/57T; PartId: 27709; Supplier 1: Digi-Key; Supplier Part Number 1: SL44-E3/57TGICT-ND; ComponentLink1Description: Datasheet; ComponentLink1URL: http://www.vishay.com/docs/88742/sl42.pdf; ComponentLink2Description: Digi-Key Listing; ComponentLink2URL: https://www.digikey.com/product-detail/en/vishay-semiconductor-diodes-division/SL44-E3-57T/SL44-E3-57TGICT-ND/1091623; Junction Operating Temperature: -55C ~ 125C; Price: 0.78; Type: Schottky; Device Package: DO-214AB, SMC; Voltage DC Reverse (Vr): 40V; Current Rectified: 4A
footprint ST DO214AB SMC
pins: 1, 2
